# Altium footprint library X98_CARRIER_V1R2_12082022.PcbLib: 104 footprints (part 2 of 7)
Each footprint in its own frame and in the unit in brackets; x right, y up, seen from the top. Pads: shape width x height; smd on the part's side, far side on the other; paste and mask are expansions set on the pad; w line width, h text height; cw(c..) or ccw(c..) is an arc to the next point about the centre after c.
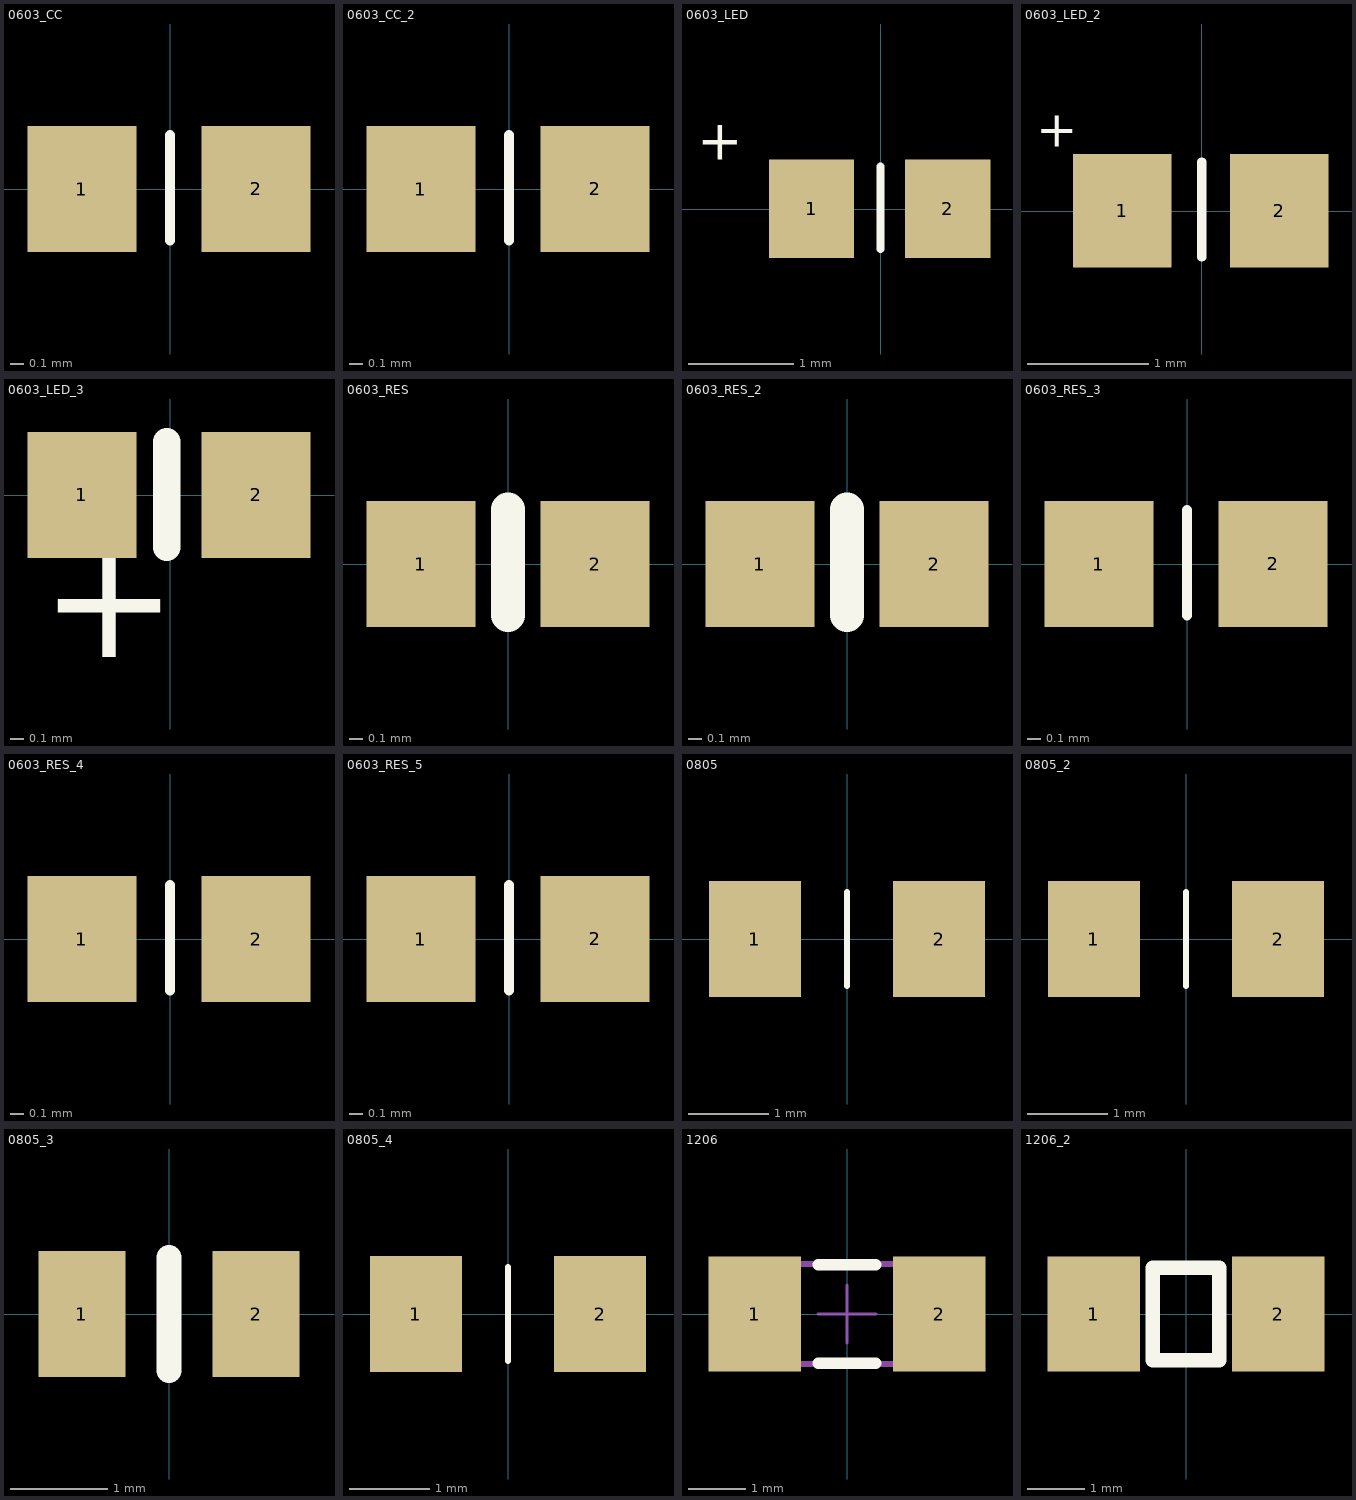
[diagram p1: the footprints below, top view; thin cyan lines are the x and y axes]

## 0603_CC [mil]
height 43.31
pads (2):
  rect 32x37 smd: 1(-25.9,0.1) 2(25.28,0.1)
Top Overlay:
  lines w3: 0,-15 0,16
3D body "User Library-0603(1608M) Cap.STEP": height 31.1, standoff 0, extent -39.38,-15 39.38,16

## 0603_CC_2 [mil]
pads (2):
  rect 32x37 smd: 1(-25.9,0.1) 2(25.28,0.1)
Top Overlay:
  lines w3: 0,-15 0,16
3D body "User Library-0603(1608M) Cap.STEP": height 31.1, standoff 0, extent -39.37,-15 39.38,16

## 0603_LED [mil]
height 43.31
pads (2):
  rect 32x37 smd: 1(-25.9,0.1) 2(25.28,0.1)
Top Overlay:
  lines w3: 0,-15 0,16
  text "+" at -68.97,18.48 h15
3D body "User Library-LTST-C190GKT.STEP": height 35.43, standoff 0, extent -33.46,-17.72 33.46,17.72

## 0603_LED_2 [mil]
pads (2):
  rect 32x37 smd: 1(-25.9,0.1) 2(25.28,0.1)
Top Overlay:
  lines w3: 0,-15 0,16
  text "+" at -54,21 h11.81
3D body "User Library-LTST-C190GKT.STEP": height 35.43, standoff 0, extent -33.46,-17.72 33.46,17.72

## 0603_LED_3 [mil]
pads (2):
  rect 32x37 smd mask+2: 1(-25.9,0.1) 2(25.28,0.1)
Top Overlay:
  lines w8: -0.98,-15.25 -0.98,15.75
  text "+" at -38,-59 h60
3D body "User Library-LTST-C190GKT.STEP": height 35.43, standoff 0, extent -33.46,-17.72 33.46,17.72

## 0603_RES [mil]
height 43.31
pads (2):
  rect 32x37 smd mask+2: 1(-25.59,0) 2(25.59,0)
Top Overlay:
  lines w10: 0,-15 0,16
3D body "User Library-Panasonic0603.STEP": height 17.72, standoff 0, extent -31.49,-16.14 31.5,16.14

## 0603_RES_2 [mil]
pads (2):
  rect 32x37 smd mask+2: 1(-25.59,0) 2(25.59,0)
Top Overlay:
  lines w10: 0,-15 0,16
3D body "User Library-Panasonic0603.STEP": height 17.72, standoff 0, extent -31.49,-16.14 31.5,16.14

## 0603_RES_3 [mil]
pads (2):
  rect 32x37 smd: 1(-25.9,0.1) 2(25.28,0.1)
Top Overlay:
  lines w3: 0,-15 0,16
3D body "User Library-Panasonic0603.STEP": height 17.72, standoff 0, extent -31,-16 31.99,16.28

## 0603_RES_4 [mil]
pads (2):
  rect 32x37 smd: 1(-25.9,0.1) 2(25.28,0.1)
Top Overlay:
  lines w3: 0,-15 0,16
3D body "User Library-Panasonic0603.STEP": height 17.72, standoff 0, extent -31,-16 31.99,16.28

## 0603_RES_5 [mil]
pads (2):
  rect 32x37 smd: 1(-25.9,0.1) 2(25.28,0.1)
Top Overlay:
  lines w3: 0,-15 0,16
3D body "User Library-Panasonic0603.STEP": height 17.72, standoff 0, extent -31,-16 31.99,16.28

## 0805 [mm] "Chip 0805, 2-Leads, Body 2.0 x 1.25mm"
height 1.25
pads (2):
  rect 1.15x1.45 smd mask+0.025: 1(-1.15,0) 2(1.15,0)
Top Overlay:
  lines w0.076: 0,-0.584 0,0.584
3D body "User Library-0805(2012M) Res.STEP": height 0.79, standoff 0, extent -1.254,-0.622 1.254,0.622

## 0805_2 [mm]
pads (2):
  rect 1.15x1.45 smd mask+0.025: 1(-1.15,0) 2(1.15,0)
Top Overlay:
  lines w0.076: 0,-0.584 0,0.584
3D body "User Library-0805(2012M) Res.STEP": height 0.79, standoff 0, extent -1.254,-0.622 1.254,0.622

## 0805_3 [mm]
pads (2):
  rect 0.9x1.3 smd mask+0.051: 1(-0.9,0) 2(0.9,0)
Top Overlay:
  lines w0.254: 0,-0.584 0,0.584
3D body "User Library-SMD RESISTOR-1.STEP": height 0.6, standoff 0, extent -1,-0.625 1,0.625

## 0805_4 [mm]
pads (2):
  rect 1.15x1.45 smd mask+0.025: 1(-1.15,0) 2(1.15,0)
Top Overlay:
  lines w0.076: 0,-0.584 0,0.584
3D body "User Library-0805(2012M) Res.STEP": height 0.79, standoff 0, extent -1.254,-0.622 1.254,0.622

## 1206 [mm] "Chip 1206, 2-Leads, Body 3.2 x 1.6mm"
height 1.6
pads (2):
  rect 1.6x2 smd mask+0.025: 1(-1.6,0) 2(1.6,0)
Top Overlay:
  lines w0.2: -0.5,-0.85 0.5,-0.85 ; -0.5,0.85 0.5,0.85
Mechanical 12:
  lines w0.001: -1.725,-0.865 1.725,-0.865 1.725,0.865 -1.725,0.865 -1.725,-0.865
Mechanical 13:
  lines w0.1: -1.725,-0.865 1.725,-0.865 1.725,0.865 -1.725,0.865 -1.725,-0.865
Mechanical 15:
  lines w0.05: -0.5,0 0.5,0 ; 0,-0.5 0,0.5
3D body "User Library-1206(3216M) Res.STEP": height 1.53, standoff 0, extent -2,-0.8 2,0.8

## 1206_2 [mm]
pads (2):
  rect 1.6x2 smd mask+0.025: 1(-1.6,0) 2(1.6,0)
Top Overlay:
  lines w0.254: -0.575,-0.8 -0.575,0.8 0.575,0.8 0.575,-0.8 -0.575,-0.8
3D body "User Library-1206(3216M) Res.STEP": height 1.53, standoff 0, extent -2,-0.8 2,0.8